# Altium footprint library Transformers.PcbLib: 93 footprints (part 2 of 7)
Each footprint in its own frame and in the unit in brackets; x right, y up, seen from the top. Pads: shape width x height; smd on the part's side, far side on the other; paste and mask are expansions set on the pad; w line width, h text height; cw(c..) or ccw(c..) is an arc to the next point about the centre after c.
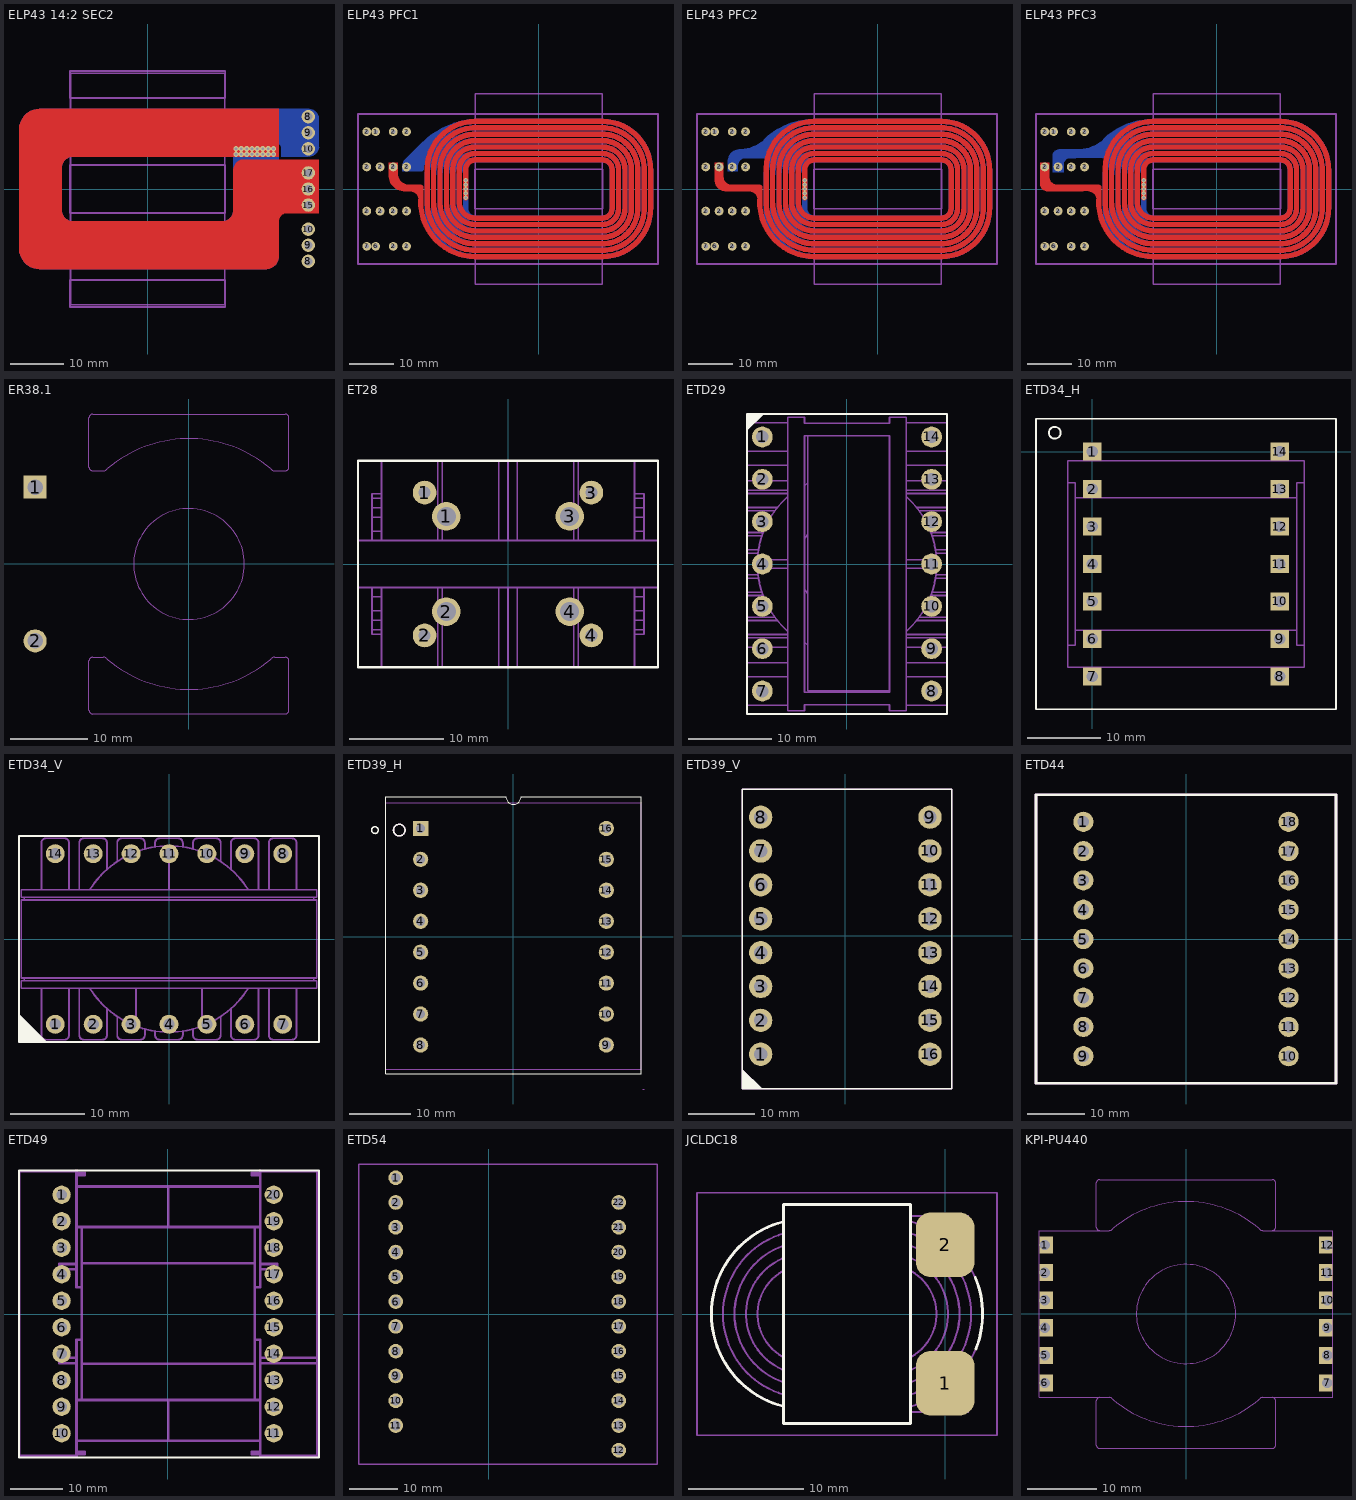
[diagram p1: the footprints below, top view; thin cyan lines are the x and y axes]

## ELP43 14:2 SEC2 [mm]
pads (9):
  round 2.5 hole 1.5: 8(30,-13.5) 8(30,13.5) 9(30,-10.5) 9(30,10.5) 10(30,-7.5) 10(30,7.5) 15(30,-3) 16(30,0) 17(30,3)
via 16.5,6.5 diameter 1 hole 0.5
via 17.5,6.5 diameter 1 hole 0.5
via 18.5,6.5 diameter 1 hole 0.5
via 19.5,6.5 diameter 1 hole 0.5
via 20.5,6.5 diameter 1 hole 0.5
via 20.5,7.5 diameter 1 hole 0.5
via 19.5,7.5 diameter 1 hole 0.5
via 18.5,7.5 diameter 1 hole 0.5
via 17.5,7.5 diameter 1 hole 0.5
via 16.5,7.5 diameter 1 hole 0.5
via 21.5,7.5 diameter 1 hole 0.5
via 21.5,6.5 diameter 1 hole 0.5
via 22.5,7.5 diameter 1 hole 0.5
via 22.5,6.5 diameter 1 hole 0.5
via 23.5,6.5 diameter 1 hole 0.5
via 23.5,7.5 diameter 1 hole 0.5
Top Layer:
  region: 22,-15 -20,-15 -20.262,-15 -20.782,-14.932 -21.289,-14.796 -21.773,-14.595 -22.227,-14.333 -22.643,-14.014 -23.014,-13.643 -23.333,-13.227 -23.595,-12.773 -23.796,-12.289 -23.932,-11.782 -24,-11.262 -24,-11 -24,11 -24,11.262 -23.932,11.782 -23.796,12.289 -23.595,12.773 -23.333,13.227 -23.014,13.643 -22.643,14.014 -22.227,14.333 -21.773,14.595 -21.289,14.796 -20.782,14.932 -20.262,15 -20,15 24.5,15 24.5,6 -14,6 -14.196,5.99 -14.581,5.914 -14.943,5.764 -15.269,5.546 -15.546,5.269 -15.764,4.943 -15.914,4.581 -15.99,4.196 -16,4 -16,-4 -15.99,-4.196 -15.914,-4.581 -15.764,-4.943 -15.546,-5.269 -15.269,-5.546 -14.943,-5.764 -14.581,-5.914 -14.196,-5.99 -14,-6 14,-6 14.196,-5.99 14.581,-5.914 14.943,-5.764 15.269,-5.546 15.546,-5.269 15.764,-4.943 15.914,-4.581 15.99,-4.196 16,-4 16,3.5 16,3.697 16.077,4.083 16.228,4.447 16.446,4.775 16.725,5.054 17.053,5.272 17.417,5.423 17.803,5.5 18,5.5 32,5.5 32,-4.5 26,-4.5 25.853,-4.507 25.565,-4.565 25.293,-4.677 25.048,-4.841 24.84,-5.048 24.677,-5.293 24.565,-5.565 24.507,-5.853 24.5,-6 24.5,-12.5 24.5,-12.746 24.404,-13.229 24.215,-13.684 23.942,-14.094 23.594,-14.442 23.184,-14.715 22.729,-14.904 22.246,-15
Bottom Layer:
  region: 18,8 24,8 24.099,8 24.283,7.924 24.424,7.783 24.5,7.599 24.5,7.5 24.5,-12.5 24.5,-12.746 24.404,-13.229 24.215,-13.684 23.942,-14.094 23.594,-14.442 23.184,-14.715 22.729,-14.904 22.246,-15 22,-15 17,-15 -20,-15 -20.262,-15 -20.782,-14.931 -21.289,-14.796 -21.773,-14.595 -22.227,-14.333 -22.643,-14.014 -23.014,-13.643 -23.333,-13.227 -23.595,-12.773 -23.796,-12.288 -23.932,-11.782 -24,-11.262 -24,-11 -24,11 -24,11.262 -23.932,11.782 -23.796,12.289 -23.595,12.773 -23.333,13.227 -23.014,13.643 -22.643,14.014 -22.227,14.333 -21.773,14.595 -21.288,14.796 -20.782,14.932 -20.262,15 -20,15 16,15 22,15 30,15 30.197,15 30.583,14.923 30.947,14.772 31.275,14.554 31.554,14.275 31.772,13.947 31.923,13.583 32,13.197 32,13 32,8 32,7.803 31.923,7.417 31.772,7.053 31.554,6.725 31.275,6.446 30.947,6.228 30.583,6.077 30.197,6 30,6 27,6 25,6 25,7.5 24.995,7.598 24.957,7.79 24.882,7.971 24.773,8.134 24.634,8.273 24.471,8.382 24.29,8.457 24.098,8.495 24,8.5 23.5,8.5 21,8.5 16,8.5 15.902,8.49 15.722,8.416 15.584,8.278 15.51,8.098 15.5,8 15.5,6.5 15.5,6.401 15.424,6.217 15.283,6.076 15.1,6 15,6 -14,6 -14.196,5.99 -14.581,5.914 -14.943,5.764 -15.269,5.546 -15.546,5.269 -15.764,4.943 -15.914,4.581 -15.99,4.196 -16,4 -16,-4 -15.99,-4.196 -15.914,-4.581 -15.764,-4.943 -15.546,-5.269 -15.269,-5.546 -14.943,-5.764 -14.581,-5.914 -14.196,-5.99 -14,-6 14,-6 14.196,-5.99 14.581,-5.914 14.943,-5.764 15.269,-5.546 15.546,-5.269 15.764,-4.943 15.914,-4.581 15.99,-4.196 16,-4 16,7.5 16,7.599 16.076,7.783 16.217,7.924 16.4,8 16.5,8
Mechanical 2:
  lines w0.35: -14.5,-22 14.5,-22 14.5,-17 -14.25,-17 -14.5,-17 -14.5,-22 ; -14.5,-4.5 14.5,-4.5 14.5,4.5 -14.5,4.5 -14.5,-4.5 ; -14.5,17 -14.5,22 14.5,22 14.5,17 -14.25,17 -14.5,17
Top Assembly:
  lines w0.35: -14.4,-21.6 14.4,-21.6 14.4,21.6 -14.4,21.6 -14.4,-21.6
3D body: height 8.3, standoff 4.2, extent -14.4,-21.6 14.4,21.6
3D body: height 4.3, standoff -5.2, extent -14.4,17.35 14.4,21.6
3D body: height 4.3, standoff -5.2, extent -14.4,-4.35 14.4,4.35
3D body: height 4.3, standoff -5.2, extent -14.4,-21.6 14.4,-17.35
3D body: height -1.1, standoff -5.2, extent -14.4,-21.6 14.4,21.6

## ELP43 PFC1 [mm]
pads (16):
  round 2 hole 1: 1(-37,13) 2(-39,13) 2(-39,-5) 2(-39,5) 2(-36,-5) 2(-36,5) 2(-33,-13) 2(-33,13) 2(-33,-5) 2(-33,5) 2(-30,-13) 2(-30,13) 2(-30,-5) 2(-30,5) 6(-37,-13) 7(-39,-13)
via -16.6,-2 diameter 1 hole 0.5
via -16.6,2 diameter 1 hole 0.5
via -16.6,-1 diameter 1 hole 0.5
via -16.6,1 diameter 1 hole 0.5
via -16.6,0 diameter 1 hole 0.5
Top Layer:
  region: -34,3 -34,2.771 -33.94,2.316 -33.821,1.873 -33.646,1.449 -33.416,1.051 -33.137,0.687 -32.813,0.363 -32.449,0.084 -32.051,-0.146 -31.627,-0.321 -31.184,-0.44 -30.729,-0.5 -30.5,-0.5 -29.275,-0.5 -29.079,-0.51 -28.694,-0.586 -28.332,-0.736 -28.006,-0.954 -27.729,-1.231 -27.511,-1.557 -27.361,-1.919 -27.285,-2.304 -27.275,-2.5 -26.175,-2.5 -26.175,0.565 -26.244,0.666 -26.426,0.828 -26.642,0.941 -26.878,1 -27,1 -29.5,1 -29.745,1.012 -30.226,1.108 -30.678,1.295 -31.086,1.567 -31.433,1.914 -31.705,2.322 -31.892,2.774 -31.988,3.255 -32,3.5 -32,6 -34,6
  lines w1.2: -26.77,-2.498 ccw(c-14.4,-2.946) -14.4,-15.324 14.4,-15.324 ccw(c14.4,-4.4) 25.324,-4.4 25.324,4.4 ccw(c14.4,4.4) 14.4,15.324 -14.4,15.324 ccw(c-14.4,4.4) -25.324,4.4 -25.324,0 -25.324,-2.946 ccw(c-14.4,-2.946) -14.4,-13.87 14.4,-13.87 ccw(c14.4,-4.4) 23.87,-4.4 23.87,4.4 ccw(c14.4,4.4) 14.4,13.87 -14.4,13.87 ccw(c-14.4,4.4) -23.87,4.4 -23.87,0 -23.87,-2.946 ccw(c-14.4,-2.946) -14.4,-12.416 14.4,-12.416 ccw(c14.4,-4.4) 22.416,-4.4 22.416,4.4 ccw(c14.4,4.4) 14.4,12.416 -14.4,12.416 ccw(c-14.4,4.4) -22.416,4.4 -22.416,0 -22.416,-2.946 ccw(c-14.4,-2.946) -14.4,-10.962 14.4,-10.962 ccw(c14.4,-4.4) 20.962,-4.4 20.962,4.4 ccw(c14.4,4.4) 14.4,10.962 -14.4,10.962 ccw(c-14.4,4.4) -20.962,4.4 -20.962,0 -20.962,-2.946 ccw(c-14.4,-2.946) -14.4,-9.508 14.4,-9.508 ccw(c14.4,-4.4) 19.508,-4.4 19.508,4.4 ccw(c14.4,4.4) 14.4,9.508 -14.4,9.508 ccw(c-14.4,4.4) -19.508,4.4 -19.508,0 -19.508,-2.946 ccw(c-14.4,-2.946) -14.4,-8.054 14.4,-8.054 ccw(c14.4,-4.4) 18.054,-4.4 18.054,4.4 ccw(c14.4,4.4) 14.4,8.054 -14.4,8.054 ccw(c-14.4,4.4) -18.054,4.4 -18.054,0 -18.054,-2.946 ccw(c-14.4,-2.946) -14.4,-6.6 14.4,-6.6 ccw(c14.4,-4.4) 16.6,-4.4 16.6,4.4 ccw(c14.4,4.4) 14.4,6.6 -14.4,6.6 ccw(c-14.4,4.4) -16.6,4.4 ; -16.6,-2 -16.6,4.4 ; -16.6,-1 -16.6,4.4
Bottom Layer:
  region: -31,5 -31,5.238 -30.907,5.704 -30.725,6.144 -30.461,6.539 -30.293,6.707 -26.449,10.551 -26.029,10.971 -25.134,11.755 -24.188,12.477 -23.197,13.134 -22.164,13.725 -21.094,14.245 -19.992,14.693 -18.863,15.067 -17.711,15.365 -16.542,15.585 -15.361,15.728 -14.173,15.791 -13.578,15.784 -14.069,15.8 -15.052,15.774 -16.03,15.673 -16.996,15.495 -17.946,15.243 -18.874,14.918 -19.773,14.521 -20.639,14.056 -21.466,13.525 -22.249,12.931 -22.984,12.278 -23.665,11.569 -24.289,10.81 -24.853,10.005 -25.352,9.158 -25.783,8.275 -26.145,7.361 -26.434,6.422 -26.649,5.463 -26.79,4.49 -26.831,4 -31,4
  lines w1.2: -26.677,4.523 cw(c-14.4,2.946) -14.4,15.324 14.4,15.324 cw(c14.4,4.4) 25.324,4.4 25.324,-4.4 cw(c14.4,-4.4) 14.4,-15.324 -14.4,-15.324 cw(c-14.4,-4.4) -25.324,-4.4 -25.324,0 -25.324,2.946 cw(c-14.4,2.946) -14.4,13.87 14.4,13.87 cw(c14.4,4.4) 23.87,4.4 23.87,-4.4 cw(c14.4,-4.4) 14.4,-13.87 -14.4,-13.87 cw(c-14.4,-4.4) -23.87,-4.4 -23.87,0 -23.87,2.946 cw(c-14.4,2.946) -14.4,12.416 14.4,12.416 cw(c14.4,4.4) 22.416,4.4 22.416,-4.4 cw(c14.4,-4.4) 14.4,-12.416 -14.4,-12.416 cw(c-14.4,-4.4) -22.416,-4.4 -22.416,0 -22.416,2.946 cw(c-14.4,2.946) -14.4,10.962 14.4,10.962 cw(c14.4,4.4) 20.962,4.4 20.962,-4.4 cw(c14.4,-4.4) 14.4,-10.962 -14.4,-10.962 cw(c-14.4,-4.4) -20.962,-4.4 -20.962,0 -20.962,2.946 cw(c-14.4,2.946) -14.4,9.508 14.4,9.508 cw(c14.4,4.4) 19.508,4.4 19.508,-4.4 cw(c14.4,-4.4) 14.4,-9.508 -14.4,-9.508 cw(c-14.4,-4.4) -19.508,-4.4 -19.508,0 -19.508,2.946 cw(c-14.4,2.946) -14.4,8.054 14.4,8.054 cw(c14.4,4.4) 18.054,4.4 18.054,-4.4 cw(c14.4,-4.4) 14.4,-8.054 -14.4,-8.054 cw(c-14.4,-4.4) -18.054,-4.4 -18.054,0 -18.054,2.946 cw(c-14.4,2.946) -14.4,6.6 14.4,6.6 cw(c14.4,4.4) 16.6,4.4 16.6,-4.4 cw(c14.4,-4.4) 14.4,-6.6 -14.4,-6.6 cw(c-14.4,-4.4) -16.6,-4.4 ; -16.6,1 -16.6,-4.4 ; -16.6,2 -16.6,-4.4
Mechanical 2:
  lines w0.35: -41,-17 27,-17 27,17 -41,17 -41,-17 ; -14.5,-4.5 14.5,-4.5 14.5,4.5 -14.5,4.5 -14.5,-4.5
Top Assembly:
  lines w0.35: -14.4,-21.6 14.4,-21.6 14.4,21.6 -14.4,21.6 -14.4,-21.6
3D body: height 8.3, standoff 4.2, extent -14.4,-21.6 14.4,21.6
3D body: height 4.3, standoff -5.2, extent -14.4,17.35 14.4,21.6
3D body: height 4.3, standoff -5.2, extent -14.4,-4.35 14.4,4.35
3D body: height 4.3, standoff -5.2, extent -14.4,-21.6 14.4,-17.35
3D body: height -1.1, standoff -5.2, extent -14.4,-21.6 14.4,21.6

## ELP43 PFC2 [mm]
pads (16):
  round 2 hole 1: 1(-37,13) 2(-39,13) 2(-39,-5) 2(-39,5) 2(-36,-5) 2(-36,5) 2(-33,-13) 2(-33,13) 2(-33,-5) 2(-33,5) 2(-30,-13) 2(-30,13) 2(-30,-5) 2(-30,5) 6(-37,-13) 7(-39,-13)
via -16.6,-2 diameter 1 hole 0.5
via -16.6,2 diameter 1 hole 0.5
via -16.6,-1 diameter 1 hole 0.5
via -16.6,1 diameter 1 hole 0.5
via -16.6,0 diameter 1 hole 0.5
Top Layer:
  region: -33.236,1 -33.408,1.007 -33.747,1.072 -34.066,1.202 -34.354,1.392 -34.599,1.635 -34.791,1.921 -34.924,2.239 -34.991,2.578 -35,2.75 -35,6 -37,6 -37,2 -37,1.754 -36.904,1.271 -36.715,0.816 -36.442,0.406 -36.094,0.058 -35.684,-0.215 -35.229,-0.404 -34.746,-0.5 -34.5,-0.5 -30.25,-0.5 -29.275,-0.5 -29.079,-0.51 -28.694,-0.586 -28.332,-0.736 -28.006,-0.954 -27.729,-1.231 -27.511,-1.557 -27.361,-1.919 -27.285,-2.304 -27.275,-2.5 -26.175,-2.5 -26.175,0.565 -26.244,0.666 -26.426,0.828 -26.642,0.941 -26.878,1 -27,1
  lines w1.2: -26.77,-2.498 ccw(c-14.4,-2.946) -14.4,-15.324 14.4,-15.324 ccw(c14.4,-4.4) 25.324,-4.4 25.324,4.4 ccw(c14.4,4.4) 14.4,15.324 -14.4,15.324 ccw(c-14.4,4.4) -25.324,4.4 -25.324,0 -25.324,-2.946 ccw(c-14.4,-2.946) -14.4,-13.87 14.4,-13.87 ccw(c14.4,-4.4) 23.87,-4.4 23.87,4.4 ccw(c14.4,4.4) 14.4,13.87 -14.4,13.87 ccw(c-14.4,4.4) -23.87,4.4 -23.87,0 -23.87,-2.946 ccw(c-14.4,-2.946) -14.4,-12.416 14.4,-12.416 ccw(c14.4,-4.4) 22.416,-4.4 22.416,4.4 ccw(c14.4,4.4) 14.4,12.416 -14.4,12.416 ccw(c-14.4,4.4) -22.416,4.4 -22.416,0 -22.416,-2.946 ccw(c-14.4,-2.946) -14.4,-10.962 14.4,-10.962 ccw(c14.4,-4.4) 20.962,-4.4 20.962,4.4 ccw(c14.4,4.4) 14.4,10.962 -14.4,10.962 ccw(c-14.4,4.4) -20.962,4.4 -20.962,0 -20.962,-2.946 ccw(c-14.4,-2.946) -14.4,-9.508 14.4,-9.508 ccw(c14.4,-4.4) 19.508,-4.4 19.508,4.4 ccw(c14.4,4.4) 14.4,9.508 -14.4,9.508 ccw(c-14.4,4.4) -19.508,4.4 -19.508,0 -19.508,-2.946 ccw(c-14.4,-2.946) -14.4,-8.054 14.4,-8.054 ccw(c14.4,-4.4) 18.054,-4.4 18.054,4.4 ccw(c14.4,4.4) 14.4,8.054 -14.4,8.054 ccw(c-14.4,4.4) -18.054,4.4 -18.054,0 -18.054,-2.946 ccw(c-14.4,-2.946) -14.4,-6.6 14.4,-6.6 ccw(c14.4,-4.4) 16.6,-4.4 16.6,4.4 ccw(c14.4,4.4) 14.4,6.6 -14.4,6.6 ccw(c-14.4,4.4) -16.6,4.4 ; -16.6,-2 -16.6,4.4 ; -16.6,-1 -16.6,4.4
Bottom Layer:
  region: -34,6.5 -33.991,6.599 -33.961,6.795 -33.917,6.989 -33.86,7.179 -33.824,7.272 -33.754,7.458 -33.56,7.804 -33.317,8.118 -33.029,8.392 -32.704,8.62 -32.349,8.797 -31.972,8.919 -31.58,8.984 -31.382,8.987 -31.018,9 -30.295,9.072 -29.58,9.205 -28.88,9.399 -28.198,9.652 -27.54,9.961 -26.911,10.326 -26.315,10.742 -26.031,10.969 -25.725,11.292 -25.078,11.9 -24.397,12.471 -23.684,13.001 -22.942,13.49 -22.172,13.935 -21.379,14.335 -20.564,14.689 -19.73,14.995 -18.879,15.252 -18.015,15.461 -17.141,15.619 -16.7,15.673 -16.7,14.533 -17.221,14.46 -18.25,14.242 -19.254,13.927 -20.224,13.519 -21.152,13.022 -22.028,12.439 -22.845,11.777 -23.597,11.041 -24.276,10.237 -24.876,9.373 -25.393,8.456 -25.821,7.495 -26,7 -30,7 -30.172,6.992 -30.508,6.925 -30.825,6.793 -31.11,6.603 -31.353,6.36 -31.543,6.075 -31.675,5.758 -31.742,5.421 -31.75,5.25 -31.75,4 -34,4
  lines w1.2: -25.888,7.555 cw(c-14.4,2.946) -14.4,15.324 14.4,15.324 cw(c14.4,4.4) 25.324,4.4 25.324,-4.4 cw(c14.4,-4.4) 14.4,-15.324 -14.4,-15.324 cw(c-14.4,-4.4) -25.324,-4.4 -25.324,0 -25.324,2.946 cw(c-14.4,2.946) -14.4,13.87 14.4,13.87 cw(c14.4,4.4) 23.87,4.4 23.87,-4.4 cw(c14.4,-4.4) 14.4,-13.87 -14.4,-13.87 cw(c-14.4,-4.4) -23.87,-4.4 -23.87,0 -23.87,2.946 cw(c-14.4,2.946) -14.4,12.416 14.4,12.416 cw(c14.4,4.4) 22.416,4.4 22.416,-4.4 cw(c14.4,-4.4) 14.4,-12.416 -14.4,-12.416 cw(c-14.4,-4.4) -22.416,-4.4 -22.416,0 -22.416,2.946 cw(c-14.4,2.946) -14.4,10.962 14.4,10.962 cw(c14.4,4.4) 20.962,4.4 20.962,-4.4 cw(c14.4,-4.4) 14.4,-10.962 -14.4,-10.962 cw(c-14.4,-4.4) -20.962,-4.4 -20.962,0 -20.962,2.946 cw(c-14.4,2.946) -14.4,9.508 14.4,9.508 cw(c14.4,4.4) 19.508,4.4 19.508,-4.4 cw(c14.4,-4.4) 14.4,-9.508 -14.4,-9.508 cw(c-14.4,-4.4) -19.508,-4.4 -19.508,0 -19.508,2.946 cw(c-14.4,2.946) -14.4,8.054 14.4,8.054 cw(c14.4,4.4) 18.054,4.4 18.054,-4.4 cw(c14.4,-4.4) 14.4,-8.054 -14.4,-8.054 cw(c-14.4,-4.4) -18.054,-4.4 -18.054,0 -18.054,2.946 cw(c-14.4,2.946) -14.4,6.6 14.4,6.6 cw(c14.4,4.4) 16.6,4.4 16.6,-4.4 cw(c14.4,-4.4) 14.4,-6.6 -14.4,-6.6 cw(c-14.4,-4.4) -16.6,-4.4 ; -16.6,1 -16.6,-4.4 ; -16.6,2 -16.6,-4.4
Mechanical 2:
  lines w0.35: -41,-17 27,-17 27,17 -41,17 -41,-17 ; -14.5,-4.5 14.5,-4.5 14.5,4.5 -14.5,4.5 -14.5,-4.5
Top Assembly:
  lines w0.35: -14.4,-21.6 14.4,-21.6 14.4,21.6 -14.4,21.6 -14.4,-21.6
3D body: height 8.3, standoff 4.2, extent -14.4,-21.6 14.4,21.6
3D body: height 4.3, standoff -5.2, extent -14.4,17.35 14.4,21.6
3D body: height 4.3, standoff -5.2, extent -14.4,-4.35 14.4,4.35
3D body: height 4.3, standoff -5.2, extent -14.4,-21.6 14.4,-17.35
3D body: height -1.1, standoff -5.2, extent -14.4,-21.6 14.4,21.6

## ELP43 PFC3 [mm]
pads (16):
  round 2 hole 1: 1(-37,13) 2(-39,13) 2(-39,-5) 2(-39,5) 2(-36,-5) 2(-36,5) 2(-33,-13) 2(-33,13) 2(-33,-5) 2(-33,5) 2(-30,-13) 2(-30,13) 2(-30,-5) 2(-30,5) 6(-37,-13) 7(-39,-13)
via -16.6,-1 diameter 1 hole 0.5
via -16.6,1 diameter 1 hole 0.5
via -16.6,0 diameter 1 hole 0.5
via -16.6,2 diameter 1 hole 0.5
via -16.6,-2 diameter 1 hole 0.5
Top Layer:
  region: -38.5,-0.5 -38.648,-0.5 -38.938,-0.442 -39.211,-0.329 -39.456,-0.165 -39.665,0.044 -39.829,0.289 -39.942,0.562 -40,0.852 -40,1 -40,6 -38,6 -38,2.75 -37.992,2.578 -37.925,2.242 -37.793,1.925 -37.603,1.64 -37.36,1.397 -37.075,1.207 -36.758,1.075 -36.422,1.008 -36.25,1 -28.75,1 -27,1 -26.878,1 -26.642,0.941 -26.426,0.828 -26.244,0.666 -26.175,0.565 -26.175,-2.5 -27.275,-2.5 -27.285,-2.304 -27.361,-1.919 -27.511,-1.557 -27.729,-1.231 -28.006,-0.954 -28.332,-0.736 -28.694,-0.586 -29.079,-0.51 -29.275,-0.5 -30.25,-0.5
  lines w1.2: -26.77,-2.498 ccw(c-14.4,-2.946) -14.4,-15.324 14.4,-15.324 ccw(c14.4,-4.4) 25.324,-4.4 25.324,4.4 ccw(c14.4,4.4) 14.4,15.324 -14.4,15.324 ccw(c-14.4,4.4) -25.324,4.4 -25.324,0 -25.324,-2.946 ccw(c-14.4,-2.946) -14.4,-13.87 14.4,-13.87 ccw(c14.4,-4.4) 23.87,-4.4 23.87,4.4 ccw(c14.4,4.4) 14.4,13.87 -14.4,13.87 ccw(c-14.4,4.4) -23.87,4.4 -23.87,0 -23.87,-2.946 ccw(c-14.4,-2.946) -14.4,-12.416 14.4,-12.416 ccw(c14.4,-4.4) 22.416,-4.4 22.416,4.4 ccw(c14.4,4.4) 14.4,12.416 -14.4,12.416 ccw(c-14.4,4.4) -22.416,4.4 -22.416,0 -22.416,-2.946 ccw(c-14.4,-2.946) -14.4,-10.962 14.4,-10.962 ccw(c14.4,-4.4) 20.962,-4.4 20.962,4.4 ccw(c14.4,4.4) 14.4,10.962 -14.4,10.962 ccw(c-14.4,4.4) -20.962,4.4 -20.962,0 -20.962,-2.946 ccw(c-14.4,-2.946) -14.4,-9.508 14.4,-9.508 ccw(c14.4,-4.4) 19.508,-4.4 19.508,4.4 ccw(c14.4,4.4) 14.4,9.508 -14.4,9.508 ccw(c-14.4,4.4) -19.508,4.4 -19.508,0 -19.508,-2.946 ccw(c-14.4,-2.946) -14.4,-8.054 14.4,-8.054 ccw(c14.4,-4.4) 18.054,-4.4 18.054,4.4 ccw(c14.4,4.4) 14.4,8.054 -14.4,8.054 ccw(c-14.4,4.4) -18.054,4.4 -18.054,0 -18.054,-2.946 ccw(c-14.4,-2.946) -14.4,-6.6 14.4,-6.6 ccw(c14.4,-4.4) 16.6,-4.4 16.6,4.4 ccw(c14.4,4.4) 14.4,6.6 -14.4,6.6 ccw(c-14.4,4.4) -16.6,4.4 -16.6,-2
Bottom Layer:
  region: -33.25,7 -33.397,6.993 -33.685,6.935 -33.957,6.823 -34.202,6.659 -34.41,6.452 -34.573,6.207 -34.685,5.935 -34.743,5.647 -34.75,5.5 -34.75,3.75 -37.25,3.75 -37.25,7.5 -37.249,7.647 -37.191,7.936 -37.077,8.207 -36.913,8.452 -36.704,8.659 -36.459,8.822 -36.186,8.934 -35.897,8.99 -35.75,8.99 -35.25,8.99 -34.25,8.987 -32.44,8.987 -31.382,8.987 -31.018,9 -30.295,9.072 -29.58,9.205 -28.88,9.399 -28.198,9.652 -27.54,9.961 -26.911,10.326 -26.315,10.742 -26.031,10.969 -25.607,11.416 -24.691,12.24 -23.712,12.989 -22.677,13.656 -21.592,14.24 -20.464,14.735 -19.299,15.138 -18.107,15.447 -17.5,15.554 -17.5,14.411 -17.982,14.309 -18.929,14.04 -19.849,13.689 -20.735,13.259 -21.58,12.752 -22.376,12.173 -23.118,11.526 -23.801,10.815 -24.418,10.048 -24.965,9.229 -25.438,8.365 -25.833,7.463 -26,7 -28.94,7 -32,7
  lines w1.2: -25.875,7.586 cw(c-14.4,2.946) -14.4,15.324 14.4,15.324 cw(c14.4,4.4) 25.324,4.4 25.324,-4.4 cw(c14.4,-4.4) 14.4,-15.324 -14.4,-15.324 cw(c-14.4,-4.4) -25.324,-4.4 -25.324,0 -25.324,2.946 cw(c-14.4,2.946) -14.4,13.87 14.4,13.87 cw(c14.4,4.4) 23.87,4.4 23.87,-4.4 cw(c14.4,-4.4) 14.4,-13.87 -14.4,-13.87 cw(c-14.4,-4.4) -23.87,-4.4 -23.87,0 -23.87,2.946 cw(c-14.4,2.946) -14.4,12.416 14.4,12.416 cw(c14.4,4.4) 22.416,4.4 22.416,-4.4 cw(c14.4,-4.4) 14.4,-12.416 -14.4,-12.416 cw(c-14.4,-4.4) -22.416,-4.4 -22.416,0 -22.416,2.946 cw(c-14.4,2.946) -14.4,10.962 14.4,10.962 cw(c14.4,4.4) 20.962,4.4 20.962,-4.4 cw(c14.4,-4.4) 14.4,-10.962 -14.4,-10.962 cw(c-14.4,-4.4) -20.962,-4.4 -20.962,0 -20.962,2.946 cw(c-14.4,2.946) -14.4,9.508 14.4,9.508 cw(c14.4,4.4) 19.508,4.4 19.508,-4.4 cw(c14.4,-4.4) 14.4,-9.508 -14.4,-9.508 cw(c-14.4,-4.4) -19.508,-4.4 -19.508,0 -19.508,2.946 cw(c-14.4,2.946) -14.4,8.054 14.4,8.054 cw(c14.4,4.4) 18.054,4.4 18.054,-4.4 cw(c14.4,-4.4) 14.4,-8.054 -14.4,-8.054 cw(c-14.4,-4.4) -18.054,-4.4 -18.054,0 -18.054,2.946 cw(c-14.4,2.946) -14.4,6.6 14.4,6.6 cw(c14.4,4.4) 16.6,4.4 16.6,-4.4 cw(c14.4,-4.4) 14.4,-6.6 -14.4,-6.6 cw(c-14.4,-4.4) -16.6,-4.4 -16.6,2
Mechanical 2:
  lines w0.35: -41,-17 -41,17 27,17 27,-17 -41,-17 ; -14.5,-4.5 -14.5,4.5 14.5,4.5 14.5,-4.5 -14.5,-4.5
Top Assembly:
  lines w0.35: -14.4,-21.6 14.4,-21.6 14.4,21.6 -14.4,21.6 -14.4,-21.6
3D body: height 8.3, standoff 4.2, extent -14.4,-21.6 14.4,21.6
3D body: height 4.3, standoff -5.2, extent -14.4,17.35 14.4,21.6
3D body: height 4.3, standoff -5.2, extent -14.4,-4.35 14.4,4.35
3D body: height 4.3, standoff -5.2, extent -14.4,-21.6 14.4,-17.35
3D body: height -1.1, standoff -5.2, extent -14.4,-21.6 14.4,21.6

## ER38.1 [mm]
pads (2):
  rect 3x3 hole 2: 1(-20,10)
  round 3 hole 2: 2(-20,-10)
Mechanical 2:
  circle w0.15: c0,0 r7.2
  lines w0.15: -12.501,-12.103 -11.15,-12.103 cw(c-11.15,-12.771) -10.679,-12.299 -10.562,-12.416 ccw(c0,0) 0.251,-16.298 ; -12.501,12.103 -11.15,12.103 ccw(c-11.15,12.771) -10.679,12.299 -10.562,12.416 cw(c0,0) 0.251,16.298 ; -0.251,-16.298 ccw(c0,0) 10.562,-12.415 10.679,-12.299 ; -0.251,16.298 cw(c0,0) 10.562,12.415 10.679,12.299 ; 10.679,-12.299 cw(c11.15,-12.771) 11.15,-12.103 ; 10.679,-12.299 cw(c11.15,-12.771) 11.15,-12.103 ; 10.679,12.299 ccw(c11.15,12.771) 11.15,12.103 ; 10.679,12.299 ccw(c11.15,12.771) 11.15,12.103 ; 11.15,-12.103 12.501,-12.103 11.15,-12.103 ; 11.15,12.103 12.501,12.103 11.15,12.103
Top Assembly:
  circle w0.15: c0,0 r7.2
  lines w0.15: -0.251,16.298 cw(c0,0) 10.561,12.416 10.678,12.299 ccw(c11.15,12.771) 11.15,12.103 12.5,12.103 ccw(c12.5,12.603) 13,12.603 13,19 ccw(c12.5,19) 12.5,19.5 -12.5,19.5 ccw(c-12.5,19) -13,19 -13,12.603 ccw(c-12.5,12.603) -12.5,12.103 -11.15,12.103 ccw(c-11.15,12.771) -10.679,12.299 -10.562,12.416 cw(c0,0) 0.251,16.298 ; -13,-19 ccw(c-12.5,-19) -12.5,-19.5 ; -13,-19 ccw(c-12.5,-19) -12.5,-19.5 ; -13,-19 -13,-12.603 ; -13,-19 -13,-12.603 ; -13,-12.603 cw(c-12.5,-12.603) -12.5,-12.103 ; -13,-12.603 cw(c-12.5,-12.603) -12.5,-12.103 ; -12.5,-19.5 12.5,-19.5 ; -12.5,-19.5 12.5,-19.5 ; -12.5,-12.103 -11.15,-12.103 ; -12.5,-12.103 -11.15,-12.103 ; -11.15,-12.103 cw(c-11.15,-12.771) -10.679,-12.299 ; -11.15,-12.103 cw(c-11.15,-12.771) -10.679,-12.299 ; -10.679,-12.299 -10.562,-12.416 ; -10.679,-12.299 -10.562,-12.416 ; -10.561,-12.416 ccw(c0,0) 0.251,-16.298 cw(c0,0) -10.561,-12.416 ; 10.561,-12.416 cw(c0,0) -0.251,-16.298 ccw(c0,0) 10.561,-12.416 ; 10.561,-12.416 10.678,-12.299 ; 10.561,-12.416 10.678,-12.299 ; 10.678,-12.299 cw(c11.15,-12.771) 11.15,-12.103 ; 10.678,-12.299 cw(c11.15,-12.771) 11.15,-12.103 ; 11.15,-12.103 12.5,-12.103 ; 11.15,-12.103 12.5,-12.103 ; 12.5,-19.5 ccw(c12.5,-19) 13,-19 ; 12.5,-19.5 ccw(c12.5,-19) 13,-19 ; 12.5,-12.103 cw(c12.5,-12.603) 13,-12.603 ; 12.5,-12.103 cw(c12.5,-12.603) 13,-12.603 ; 13,-19 13,-12.603 ; 13,-19 13,-12.603
3D body "ER38.1-16-25.STEP": height -1, standoff -9, extent -12.7,-19.05 12.7,19.05
3D body "ER38.1-16-25.STEP": height -9, standoff -17, extent -12.7,-19.05 12.7,19.05

## ET28 [mil]
pads (8):
  round 100 hole 50: 1(-350,300) 2(-350,-300) 3(350,300) 4(350,-300)
  round 120 hole 80: 1(-259.06,200) 2(-259.06,-200) 3(259.06,200) 4(259.06,-200)
Top Overlay:
  lines w10: -629.92,-433.07 629.92,-433.07 629.92,433.07 -629.92,433.07 -629.92,-433.07
Top Assembly:
  lines w7.01: -629.92,-98.43 629.92,-98.43 ; -629.92,98.43 629.92,98.43 ; -570.87,-275.59 -531.5,-275.59 ; -570.87,-236.22 -531.5,-236.22 ; -570.87,-196.85 -531.5,-196.85 ; -570.87,-137.8 -531.5,-137.8 ; -570.87,-98.43 -570.87,-295.28 -531.5,-295.28 ; -570.87,98.43 -570.87,295.28 -531.5,295.28 ; -570.87,137.8 -531.5,137.8 ; -570.87,196.85 -531.5,196.85 ; -570.87,236.22 -531.5,236.22 ; -570.87,275.59 -531.5,275.59 ; -531.5,-98.43 -531.5,-433.07 531.5,-433.07 531.5,-98.43 ; -531.5,98.43 -531.5,433.07 531.5,433.07 531.5,98.43 ; -295.28,-433.07 -295.28,-98.43 ; -295.28,98.43 -295.28,433.07 ; -275.59,-433.07 -275.59,-98.43 ; -275.59,98.43 -275.59,433.07 ; -39.37,-433.07 -39.37,-98.43 ; -39.37,98.43 -39.37,433.07 ; 0,-433.07 0,-98.43 ; 0,98.43 0,433.07 ; 39.37,-433.07 39.37,-98.43 ; 39.37,98.43 39.37,433.07 ; 275.59,-433.07 275.59,-98.43 ; 275.59,98.43 275.59,433.07 ; 295.28,-433.07 295.28,-98.43 ; 295.28,98.43 295.28,433.07 ; 531.5,-295.28 570.87,-295.28 570.87,-98.43 ; 531.5,-275.59 570.87,-275.59 ; 531.5,-236.22 570.87,-236.22 ; 531.5,-196.85 570.87,-196.85 ; 531.5,-137.8 570.87,-137.8 ; 531.5,137.8 570.87,137.8 ; 531.5,196.85 570.87,196.85 ; 531.5,236.22 570.87,236.22 ; 531.5,275.59 570.87,275.59 ; 531.5,295.28 570.87,295.28 570.87,98.43
3D body "Triad Magnetics-ET2835-037.step": height 1539.51, standoff -114.49, extent -620,-450.83 620,474.17

## ETD29 [mm]
pads (14):
  round 2.5 hole 1.5 unplated: 1(-10.16,15.24) 2(-10.16,10.16) 3(-10.16,5.08) 4(-10.16,0) 5(-10.16,-5.08) 6(-10.16,-10.16) 7(-10.16,-15.24) 8(10.16,-15.24) 9(10.16,-10.16) 10(10.16,-5.08) 11(10.16,0) 12(10.16,5.08) 13(10.16,10.16) 14(10.16,15.24)
Top Overlay:
  region: -12,16 -10,18 -12,18
  lines w0.254: -12,-18 -12,18 12,18 12,-18 -12,-18
Top Assembly:
  lines w0.2: -10.671,-1.3 -12,-1.3 ; -10.671,1.3 -12,1.3 ; -10.615,-1.7 -12,-1.7 -12,-1.3 ; -10.615,1.7 -12,1.7 -12,1.3 ; -10.205,-3.38 -12,-3.38 -12,-3.78 ; -10.205,3.38 -12,3.38 -12,3.78 ; -10.064,-3.78 -12,-3.78 ; -10.064,3.78 -12,3.78 ; -8.652,-6.38 -12,-6.38 ; -8.652,6.38 -12,6.38 ; -8.342,-6.78 -12,-6.78 -12,-6.38 ; -8.342,6.78 -12,6.78 -12,6.38 ; -7.1,-16.94 -12,-16.94 -12,-13.54 -7.1,-13.54 ; -7.1,-11.86 -12,-11.86 -12,-10 ; -7.1,-10 -12,-10 ; -7.1,-8.86 -12,-8.86 ; -7.1,-8.46 -12,-8.46 -12,-8.86 ; -7.1,-8.072 cw(c0,0) -7.1,8.072 ; -7.1,-0.5 -10.5,-0.5 -10.5,0.5 -7.1,0.5 ; -7.1,8.46 -12,8.46 -12,8.86 ; -7.1,8.86 -12,8.86 ; -7.1,10 -12,10 ; -7.1,11.86 -12,11.86 -12,10 ; -7.1,13.54 -12,13.54 -12,16.94 -7.1,16.94 ; -5.1,-9.463 -4.7,-9.668 ; -5.1,-2.966 -4.888,-3.304 -4.7,-3.567 ; -5.1,2.966 -4.888,3.304 -4.7,3.567 ; -5.1,9.463 -4.7,9.668 ; 7.1,-16.94 12,-16.94 12,-13.54 7.1,-13.54 ; 7.1,-11.86 12,-11.86 12,-10 ; 7.1,-10 12,-10 ; 7.1,-8.86 12,-8.86 ; 7.1,-8.46 12,-8.46 12,-8.86 ; 7.1,-8.072 ccw(c0,0) 7.1,8.072 ; 7.1,-0.5 10.5,-0.5 10.5,0.5 7.1,0.5 ; 7.1,8.46 12,8.46 12,8.86 ; 7.1,8.86 12,8.86 ; 7.1,10 12,10 ; 7.1,11.86 12,11.86 12,10 ; 7.1,13.54 12,13.54 12,16.94 7.1,16.94 ; 8.342,-6.78 12,-6.78 12,-6.38 ; 8.342,6.78 12,6.78 12,6.38 ; 8.652,-6.38 12,-6.38 ; 8.652,6.38 12,6.38 ; 10.064,-3.78 12,-3.78 ; 10.064,3.78 12,3.78 ; 10.205,-3.38 12,-3.38 12,-3.78 ; 10.205,3.38 12,3.38 12,3.78 ; 10.615,-1.7 12,-1.7 12,-1.3 ; 10.615,1.7 12,1.7 12,1.3 ; 10.671,-1.3 12,-1.3 ; 10.671,1.3 12,1.3 ; -12,-10 -12,-8.86 ; -12,-6.38 -12,-3.78 ; -12,-1.3 -12,1.3 ; -12,3.78 -12,6.38 ; -12,8.86 -12,10 ; -4.7,15.4 -5.1,15.4 -5.1,-15.4 5.1,-15.4 5.1,-15.2 ; -4.7,15.4 -4.7,-15.2 5.1,-15.2 ; -4.7,15.4 5.1,15.4 5.1,-15.2 ; 12,-10 12,-8.86 ; 12,-6.38 12,-3.78 ; 12,-1.3 12,1.3 ; 12,3.78 12,6.38 ; 12,8.86 12,10 ; -7.1,-17.6 -7.1,17.6 -5.1,17.6 -5.1,16.9 5.1,16.9 5.1,17.6 7.1,17.6 7.1,-17.6 5.1,-17.6 5.1,-16.9 -5.1,-16.9 -5.1,-17.6 -7.1,-17.6
3D body "User Library-EDT29_V.step": height 41.87, standoff -2.08, extent -12,-17.6 12,17.6

## ETD34_H [mm]
pads (14):
  rect 2.5x2.5 hole 1.5: 1(0,0) 2(0,-5.08) 3(0,-10.16) 4(0,-15.24) 5(0,-20.32) 6(0,-25.4) 7(0,-30.48) 8(25.4,-30.48) 9(25.4,-25.4) 10(25.4,-20.32) 11(25.4,-15.24) 12(25.4,-10.16) 13(25.4,-5.08) 14(25.4,0)
Top Overlay:
  circle w0.254: c-5.08,2.54 r0.803
  lines w0.254: -7.62,-34.925 -7.62,4.445 33.02,4.445 33.02,-34.925 -7.62,-34.925
Top Assembly:
  lines w0.178: -3.3,-26.24 -2.3,-26.24 -2.3,-4.24 -3.3,-4.24 ; -2.3,-24.24 27.7,-24.24 ; -2.3,-6.24 27.7,-6.24 ; 28.7,-26.24 27.7,-26.24 27.7,-4.24 28.7,-4.24 ; -3.3,-29.24 28.7,-29.24 28.7,-1.24 -3.3,-1.24 -3.3,-29.24
3D body "User Library-ETD34.STEP": height 32.9, standoff -2.44, extent -7.8,-35.04 33.2,4.56

## ETD34_V [mm]
pads (14):
  round 2.54 hole 1.5: 1(-15.24,-11.43) 2(-10.16,-11.43) 3(-5.08,-11.43) 4(0,-11.43) 5(5.08,-11.43) 6(10.16,-11.43) 7(15.24,-11.43) 8(15.24,11.43) 9(10.16,11.43) 10(5.08,11.43) 11(0,11.43) 12(-5.08,11.43) 13(-10.16,11.43) 14(-15.24,11.43)
Top Overlay:
  region: -20.1,-10.1 -20.1,-13.8 -16.4,-13.8
  lines w0.254: -20.1,-13.8 20.1,-13.8 20.1,13.8 -20.1,13.8 -20.1,-13.8
Top Assembly:
  lines w0.254: -19.4,-5.6 -19.4,-5.2 ; -19.4,5.2 -19.4,5.6 ; -17.1,-6.6 -17.1,-12.9 ccw(c-16.5,-12.9) -16.5,-13.5 -14,-13.5 ccw(c-14,-12.9) -13.4,-12.9 -13.4,-6.6 ; -17.1,6.6 -17.1,12.9 cw(c-16.5,12.9) -16.5,13.5 -14,13.5 cw(c-14,12.9) -13.4,12.9 -13.4,6.6 ; -12.02,-6.6 -12.02,-12.9 ccw(c-11.42,-12.9) -11.42,-13.5 -8.92,-13.5 ccw(c-8.92,-12.9) -8.32,-12.9 -8.32,-9.31 ; -12.02,6.6 -12.02,12.9 cw(c-11.42,12.9) -11.42,13.5 -8.92,13.5 cw(c-8.92,12.9) -8.32,12.9 -8.32,9.31 ; -10.6,-6.6 ccw(c0,0) 10.601,-6.599 ; -10.6,6.6 cw(c0,0) 10.601,6.599 ; -6.94,-10.37 -6.94,-12.9 ccw(c-6.34,-12.9) -6.34,-13.5 -3.84,-13.5 ccw(c-3.84,-12.9) -3.24,-12.9 -3.24,-12.06 ; -6.94,10.37 -6.94,12.9 cw(c-6.34,12.9) -6.34,13.5 -3.84,13.5 cw(c-3.84,12.9) -3.24,12.9 -3.24,12.06 ; -4.4,-11.6 -4.4,-6.6 ; -1.86,-12.35 -1.86,-12.9 ccw(c-1.26,-12.9) -1.26,-13.5 1.24,-13.5 ccw(c1.24,-12.9) 1.84,-12.9 ; -1.86,12.35 -1.86,12.9 cw(c-1.26,12.9) -1.26,13.5 1.24,13.5 cw(c1.24,12.9) 1.84,12.9 ; 0,6.6 0,12.4 ; 1.86,-12.9 1.86,-12.35 ; 1.86,12.35 1.86,12.9 ; 3.22,-12.9 ccw(c3.82,-12.9) 3.82,-13.5 6.32,-13.5 ccw(c6.32,-12.9) 6.92,-12.9 ; 3.22,12.9 cw(c3.82,12.9) 3.82,13.5 6.32,13.5 cw(c6.32,12.9) 6.92,12.9 ; 3.24,-12.9 3.24,-12.06 ; 3.24,12.06 3.24,12.9 ; 4.4,-11.6 4.4,-6.6 ; 6.94,-12.9 6.94,-10.37 ; 6.94,10.37 6.94,12.9 ; 8.3,-12.9 ccw(c8.9,-12.9) 8.9,-13.5 11.4,-13.5 ccw(c11.4,-12.9) 12,-12.9 12,-6.6 ; 8.3,12.9 cw(c8.9,12.9) 8.9,13.5 11.4,13.5 cw(c11.4,12.9) 12,12.9 12,6.6 ; 8.32,-12.9 8.32,-9.31 ; 8.32,9.31 8.32,12.9 ; 13.38,-6.6 13.38,-12.9 ccw(c13.98,-12.9) 13.98,-13.5 16.48,-13.5 ccw(c16.48,-12.9) 17.08,-12.9 17.08,-6.6 ; 13.38,6.6 13.38,12.9 cw(c13.98,12.9) 13.98,13.5 16.48,13.5 cw(c16.48,12.9) 17.08,12.9 17.08,6.6 ; 19.4,-5.6 19.4,-5.2 ; 19.4,5.2 19.4,5.6 ; -19.8,-6.6 -19.8,-5.6 19.8,-5.6 19.8,-6.6 -19.8,-6.6 ; -19.8,-5.2 -19.8,5.2 19.8,5.2 19.8,-5.2 -19.8,-5.2 ; -19.8,5.6 -19.8,6.6 19.8,6.6 19.8,5.6 -19.8,5.6
  text "1" at -19.5,-12.8 h1.59
3D body "User Library-ETD34-17-11 Vertical Bobbin Part No_ FD9640.STEP": height 44.77, standoff -4.93, extent -19.685,-13.208 19.615,13.152

## ETD39_H [mm] "THT, Body 41.90X49.0mm, 16Pins,Pitch 5.0mm"
height 31.75
pads (16):
  rect 2.5x2.5 hole 1.5: 1(-15.24,17.78)
  round 2.5 hole 1.5: 2(-15.24,12.7) 3(-15.24,7.62) 4(-15.24,2.54) 5(-15.24,-2.54) 6(-15.24,-7.62) 7(-15.24,-12.7) 8(-15.24,-17.78) 9(15.24,-17.78) 10(15.24,-12.7) 11(15.24,-7.62) 12(15.24,-2.54) 13(15.24,2.54) 14(15.24,7.62) 15(15.24,12.7) 16(15.24,17.78)
Top Overlay:
  circle w0.254: c-22.75,17.5 r0.552
  circle w0.254: c-18.75,17.5 r0.95
  lines w0.2: -21,-22.5 -21,23 -1.25,23 ccw(c0,23) 1.25,23 21,23 21,-22.5 -21,-22.5
Top Assembly:
  circle w0.254: c-18.75,17.5 r0.95
  lines w0.2: -21,-21.75 21,-21.75 21,22 -21,22 -21,-21.75
Top Component Outline (Mech15):
  lines w0.2: 21.25,-25 21.5,-25
3D body "070-5724.stp": height 32.31, standoff -3.79, extent -20.5,-21.25 20.5,21.45

## ETD39_V [mm]
pads (16):
  round 3.5 hole 2 paste-25.4: 1(-12.7,-17.78) 2(-12.7,-12.7) 3(-12.7,-7.62) 4(-12.7,-2.54) 5(-12.7,2.54) 6(-12.7,7.62) 7(-12.7,12.7) 8(-12.7,17.78) 9(12.7,17.78) 10(12.7,12.7) 11(12.7,7.62) 12(12.7,2.54) 13(12.7,-2.54) 14(12.7,-7.62) 15(12.7,-12.7) 16(12.7,-17.78)
Top Overlay:
  region: -15.5,-20 -12.5,-23 -13.5,-23 -15.5,-23
  lines w0.2: -15.5,-23 16,-23 16,22 -15.5,22 -15.5,-23
Top Assembly:
  region: -15.5,-20 -12.5,-23 -13.5,-23 -15.5,-23
  lines w0.2: -15.5,-23 -15.5,22 16,22 16,-23 -15.5,-23
3D body "ETD39[ver].SLDPRT": height 53.92, standoff -0.55, extent -14,-22.02 14.4,21.78

## ETD44 [mm]
pads (18):
  round 3.5 hole 2 unplated: 1(-17.78,20.32) 2(-17.78,15.24) 3(-17.78,10.16) 4(-17.78,5.08) 5(-17.78,0) 6(-17.78,-5.08) 7(-17.78,-10.16) 8(-17.78,-15.24) 9(-17.78,-20.32) 10(17.78,-20.32) 11(17.78,-15.24) 12(17.78,-10.16) 13(17.78,-5.08) 14(17.78,0) 15(17.78,5.08) 16(17.78,10.16) 17(17.78,15.24) 18(17.78,20.32)
Top Overlay:
  lines w0.5: -26,-25 26,-25 26,25 -26,25 -26,-25
Top Assembly:
  lines w0.5: -26,-25 -26,25 26,25 26,-25 -26,-25
3D body "ETD44 Transformer assembly.STEP": height 40.51, standoff -3.75, extent -26.1,-24.8 26.1,24.8

## ETD49 [mm]
pads (20):
  round 3.5 hole 2: 1(-20.32,22.86) 2(-20.32,17.78) 3(-20.32,12.7) 4(-20.32,7.62) 5(-20.32,2.54) 6(-20.32,-2.54) 7(-20.32,-7.62) 8(-20.32,-12.7) 9(-20.32,-17.78) 10(-20.32,-22.86) 11(20.32,-22.86) 12(20.32,-17.78) 13(20.32,-12.7) 14(20.32,-7.62) 15(20.32,-2.54) 16(20.32,2.54) 17(20.32,7.62) 18(20.32,12.7) 19(20.32,17.78) 20(20.32,22.86)
Top Overlay:
  lines w0.3: -28.5,-27.5 29,-27.5 29,27.5 -28.5,27.5 -28.5,-27.5
Top Assembly:
  lines w0.5: -17.667,-27.158 -17.48,-27.258 -17.48,-27.158 ; -17.667,27.342 -17.48,27.442 -17.48,27.342 ; -17.48,-26.858 -15.88,-26.858 -15.88,-26.458 -17.48,-26.458 ; -17.48,-24.258 0.12,-24.258 ; -17.48,-16.491 0.12,-16.491 ; -17.48,-9.408 -20.78,-9.408 -20.78,-8.408 -17.48,-8.408 ; -17.48,8.592 -20.78,8.592 -20.78,9.592 -17.48,9.592 ; -17.48,16.676 0.12,16.676 ; -17.48,24.442 0.12,24.442 ; -17.48,26.642 -15.88,26.642 -15.88,27.042 -17.48,27.042 ; -16.48,-16.491 -16.48,-4.908 ; -16.48,-9.508 16.72,-9.508 ; -16.48,9.692 16.72,9.692 ; -16.48,16.676 -16.48,5.092 ; 16.72,-16.491 16.72,-4.908 ; 16.72,16.676 16.72,5.092 ; 17.72,-26.858 16.12,-26.858 16.12,-26.458 17.72,-26.458 ; 17.72,-24.258 0.12,-24.258 ; 17.72,-16.491 0.12,-16.491 ; 17.72,-9.408 28.72,-9.408 ; 17.72,-8.408 28.72,-8.408 ; 17.72,8.592 21.02,8.592 21.02,9.592 17.72,9.592 ; 17.72,16.676 0.12,16.676 ; 17.72,24.442 0.12,24.442 ; 17.72,26.642 16.12,26.642 16.12,27.042 17.72,27.042 ; 17.908,-27.158 17.72,-27.258 17.72,-27.158 ; 17.908,27.342 17.72,27.442 17.72,27.342 ; -17.48,-27.158 -17.48,-14.394 -17.48,-4.908 -16.48,-4.908 ; -17.48,-27.158 -28.48,-27.158 -28.48,27.342 -17.48,27.342 ; -17.48,27.342 -17.48,14.578 -17.48,5.092 -16.48,5.092 ; -16.48,-4.908 -16.48,5.092 ; 0.12,-24.258 0.12,-16.491 ; 0.12,16.676 0.12,24.442 ; 16.72,-4.908 17.72,-4.908 17.72,-14.394 17.72,-27.158 ; 16.72,-4.908 16.72,5.092 ; 16.72,5.092 17.72,5.092 17.72,14.578 17.72,27.342 ; 17.72,-27.158 28.72,-27.158 28.72,-9.408 ; 17.72,27.342 28.72,27.342 28.72,-8.408 ; 28.72,-9.408 28.72,-8.408
3D body "User Library-ETD49_NO_AIRGAP.STEP": height 40.74, standoff -3.86, extent -28.6,-27.35 28.6,27.35

## ETD54 [mm]
pads (22):
  round 3 hole 2: 1(-19.05,27.94) 2(-19.05,22.86) 3(-19.05,17.78) 4(-19.05,12.7) 5(-19.05,7.62) 6(-19.05,2.54) 7(-19.05,-2.54) 8(-19.05,-7.62) 9(-19.05,-12.7) 10(-19.05,-17.78) 11(-19.05,-22.86) 12(26.67,-27.94) 13(26.67,-22.86) 14(26.67,-17.78) 15(26.67,-12.7) 16(26.67,-7.62) 17(26.67,-2.54) 18(26.67,2.54) 19(26.67,7.62) 20(26.67,12.7) 21(26.67,17.78) 22(26.67,22.86)
Top Assembly:
  lines w0.3: -26.67,-30.75 34.6,-30.75 34.6,30.75 -26.67,30.75 -26.67,-30.75
3D body "ETD54-K-H-22P-FUAN.STEP": height 45.55, standoff -4.2, extent -26.6,-30.75 34.6,30.75

## JCLDC18 [mm]
pads (2):
  rrect50% 5.08x5.588 smd: 1(0,-6) 2(0,6)
Top Overlay:
  lines w0.254: -13.995,-8.001 cw(c-12,0) -13.995,8.001 ; 2.613,3.169 cw(c-5,0) 2.662,-3.049 ; -14,-9.5 -3,-9.5 -3,9.5 -14,9.5 -14,-9.5
Top Assembly:
  lines w0.178: -14.134,-4.792 cw(c-12,0) -14.134,4.792 ; -14.104,-3.688 cw(c-12,0) -14.104,3.688 ; -13.995,-8.001 cw(c-12,0) -13.995,8.001 ; -13.985,-6.969 cw(c-12,0) -13.985,6.969 ; -13.972,-5.927 cw(c-12,0) -13.972,5.927 ; -3.028,-5.927 ccw(c-5,0) -3.028,5.927 ; -3.015,-6.969 ccw(c-5,0) -3.015,6.969 ; -3.005,-8.001 ccw(c-5,0) -3.005,8.001 ; -3,-8.5 1.5,-8.5 2,-8.5 2,-4.5 ; -3,8.5 2,8.5 2,4.5 ; -2.896,-3.688 ccw(c-5,0) -2.896,3.688 ; -2.866,-4.792 ccw(c-5,0) -2.866,4.792 ; -14,-9.5 -3,-9.5 -3,9.5 -14,9.5 -14,-9.5
Top Component Outline (Mech15):
  lines w0.15: -21.5,-10.5 4.5,-10.5 4.5,10.5 -21.5,10.5 -21.5,-10.5
3D body: height 5, standoff 1, extent -20.027,-7.5 2.973,0
3D body: height 5, standoff 1, extent -20,0 3,7.5
3D body: height 6, standoff 0.5, extent -14,-9.5 -3,9.5

## KPI-PU440 [mm]
pads (12):
  rect 2x2.5 hole 1.5 copper offset 0.25,0: 1(-20.5,10) 2(-20.5,6) 3(-20.5,2) 4(-20.5,-2) 5(-20.5,-6) 6(-20.5,-10)
  rect 2x2.5 hole 1.5 copper offset -0.25,0: 7(20.5,-10) 8(20.5,-6) 9(20.5,-2) 10(20.5,2) 11(20.5,6) 12(20.5,10)
Mechanical 2:
  circle w0.15: c0,0 r7.2
  lines w0.15: -0.251,-16.298 ccw(c0,0) 10.562,-12.415 10.679,-12.299 ; -0.251,16.298 cw(c0,0) 10.562,12.415 10.679,12.299 ; 0.251,-16.298 cw(c0,0) -10.562,-12.415 -10.679,-12.299 ccw(c-11.15,-12.771) -11.15,-12.103 -12.501,-12.103 -21.25,-12.103 -21.25,12.103 -12.501,12.103 -11.15,12.103 ccw(c-11.15,12.771) -10.679,12.299 -10.562,12.416 cw(c0,0) 0.251,16.298 ; 21.3,-0.5 21.3,12.103 12.501,12.103 ; 21.3,0.5 21.3,-12.103 12.501,-12.103 ; 10.679,-12.299 cw(c11.15,-12.771) 11.15,-12.103 ; 10.679,-12.299 cw(c11.15,-12.771) 11.15,-12.103 ; 10.679,12.299 ccw(c11.15,12.771) 11.15,12.103 ; 10.679,12.299 ccw(c11.15,12.771) 11.15,12.103 ; 11.15,-12.103 12.501,-12.103 ; 11.15,-12.103 12.501,-12.103 ; 11.15,12.103 12.501,12.103 ; 11.15,12.103 12.501,12.103
Top Assembly:
  circle w0.15: c0,0 r7.2
  lines w0.15: -0.251,16.298 cw(c0,0) 10.561,12.416 10.678,12.299 ccw(c11.15,12.771) 11.15,12.103 12.5,12.103 ccw(c12.5,12.603) 13,12.603 13,19 ccw(c12.5,19) 12.5,19.5 -12.5,19.5 ccw(c-12.5,19) -13,19 -13,12.603 ccw(c-12.5,12.603) -12.5,12.103 -11.15,12.103 ccw(c-11.15,12.771) -10.679,12.299 -10.562,12.416 cw(c0,0) 0.251,16.298 ; -13,-19 ccw(c-12.5,-19) -12.5,-19.5 ; -13,-19 ccw(c-12.5,-19) -12.5,-19.5 ; -13,-19 -13,-12.603 ; -13,-19 -13,-12.603 ; -13,-12.603 cw(c-12.5,-12.603) -12.5,-12.103 ; -13,-12.603 cw(c-12.5,-12.603) -12.5,-12.103 ; -12.5,-19.5 12.5,-19.5 ; -12.5,-19.5 12.5,-19.5 ; -12.5,-12.103 -11.15,-12.103 ; -12.5,-12.103 -11.15,-12.103 ; -11.15,-12.103 cw(c-11.15,-12.771) -10.679,-12.299 ; -11.15,-12.103 cw(c-11.15,-12.771) -10.679,-12.299 ; -10.679,-12.299 -10.562,-12.416 ; -10.679,-12.299 -10.562,-12.416 ; -10.561,-12.416 ccw(c0,0) 0.251,-16.298 cw(c0,0) -10.561,-12.416 ; 10.561,-12.416 cw(c0,0) -0.251,-16.298 ccw(c0,0) 10.561,-12.416 ; 10.561,-12.416 10.678,-12.299 ; 10.561,-12.416 10.678,-12.299 ; 10.678,-12.299 cw(c11.15,-12.771) 11.15,-12.103 ; 10.678,-12.299 cw(c11.15,-12.771) 11.15,-12.103 ; 11.15,-12.103 12.5,-12.103 ; 11.15,-12.103 12.5,-12.103 ; 12.5,-19.5 ccw(c12.5,-19) 13,-19 ; 12.5,-19.5 ccw(c12.5,-19) 13,-19 ; 12.5,-12.103 cw(c12.5,-12.603) 13,-12.603 ; 12.5,-12.103 cw(c12.5,-12.603) 13,-12.603 ; 13,-19 13,-12.603 ; 13,-19 13,-12.603
3D body "ER38.1-16-25.STEP": height 17, standoff 9, extent -12.7,-19.05 12.7,19.05
3D body "ER38.1-16-25.STEP": height -2, standoff -10, extent -12.7,-19.05 12.7,19.05